# Altium footprint library LukaLIBRARY.PcbLib: 772 footprints (part 48 of 49)
Each footprint in its own frame and in the unit in brackets; x right, y up, seen from the top. Pads: shape width x height; smd on the part's side, far side on the other; paste and mask are expansions set on the pad; w line width, h text height; cw(c..) or ccw(c..) is an arc to the next point about the centre after c.
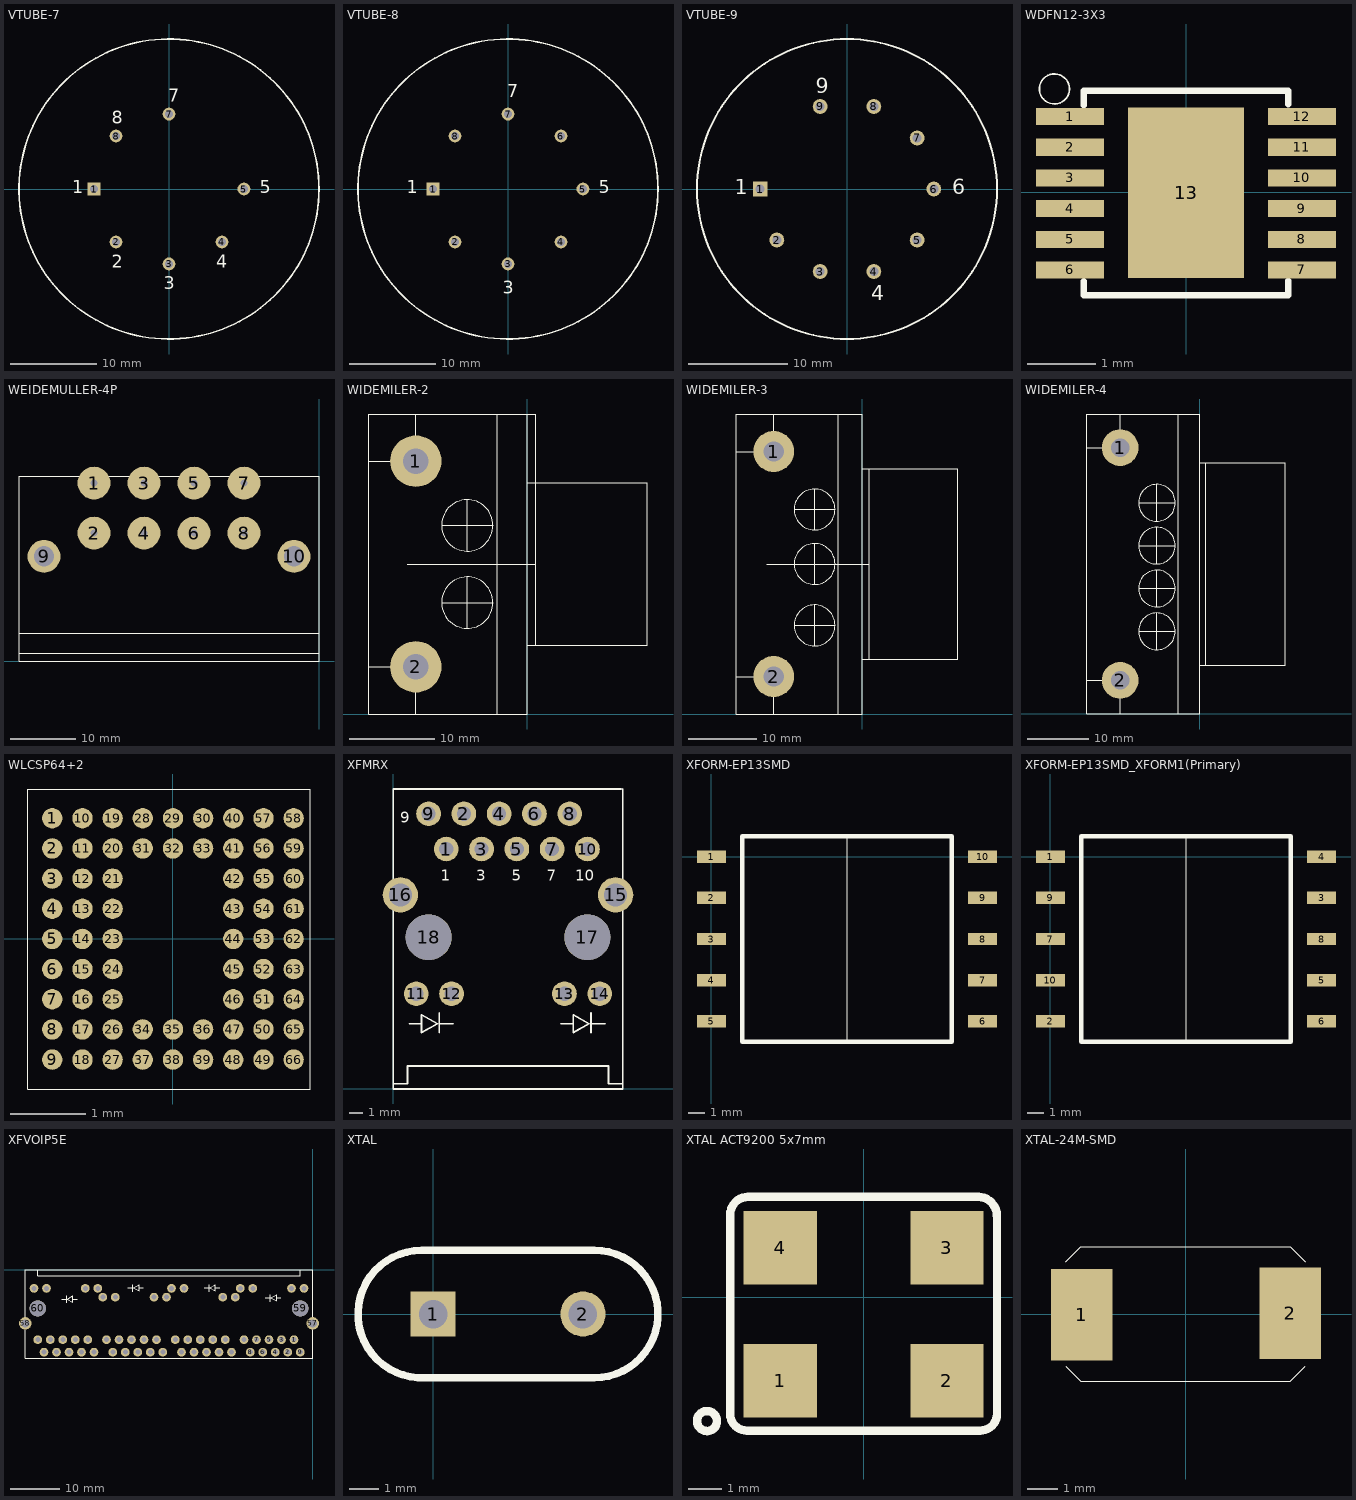
[diagram p47: the footprints below, top view; thin cyan lines are the x and y axes]

## VTUBE-7 [mm] "Vacuum Tube; 7 Leads"
height 108
pads (7):
  rect 1.5x1.5 hole 0.9: 1(-8.725,0)
  round 1.5 hole 0.9: 2(-6.17,-6.17) 3(0,-8.725) 4(6.17,-6.17) 5(8.725,0) 7(0,8.725) 8(-6.17,6.17)
Top Overlay:
  circle w0.2: c0,0 r17.462
  text "1" at -11.265,-0.508 h1.5
  text "2" at -6.693,-9.144 h1.5
  text "3" at -0.597,-11.684 h1.5
  text "4" at 5.499,-9.144 h1.5
  text "5" at 10.579,-0.508 h1.5
  text "7" at -0.089,10.16 h1.5
  text "8" at -6.693,7.62 h1.5

## VTUBE-8 [mm] "Vacuum Tube; 8 Leads"
height 108
pads (8):
  rect 1.5x1.5 hole 0.9: 1(-8.725,0)
  round 1.5 hole 0.9: 2(-6.17,-6.17) 3(0,-8.725) 4(6.17,-6.17) 5(8.725,0) 6(6.17,6.17) 7(0,8.725) 8(-6.17,6.17)
Top Overlay:
  circle w0.2: c0,0 r17.462
  text "7" at -0.089,10.668 h1.5
  text "5" at 10.579,-0.508 h1.5
  text "3" at -0.597,-12.192 h1.5
  text "1" at -11.773,-0.508 h1.5

## VTUBE-9 [mm] "Vacuum Tube; 9 Leads"
height 66.7
pads (9):
  rect 1.5x1.5 hole 0.9: 1(-8.725,0)
  round 1.5 hole 0.9: 2(-7.059,-5.128) 3(-2.696,-8.298) 4(2.696,-8.298) 5(7.059,-5.128) 6(8.725,0) 7(7.059,5.128) 8(2.696,8.298) 9(-2.696,8.298)
Top Overlay:
  circle w0.2: c0,0 r15.081
  text "4" at 2.451,-11.176 h1.5
  text "6" at 10.579,-0.508 h1.5
  text "9" at -3.137,9.652 h1.5
  text "1" at -11.265,-0.508 h1.5

## WDFN12-3X3 [mm]
pads (13):
  rect 1x0.25 smd mask-25.4: 1(-1.7,1.11) 2(-1.7,0.66) 3(-1.7,0.21) 4(-1.7,-0.24) 5(-1.7,-0.69) 6(-1.7,-1.14) 7(1.7,-1.14) 8(1.7,-0.69) 9(1.7,-0.24) 10(1.7,0.21) 11(1.7,0.66) 12(1.7,1.11)
  rect 1.7x2.5 smd mask-25.4: 13(0,-0.01)
Top Overlay:
  circle w0.025: c-1.93,1.515 r0.221
  lines w0.1: -1.5,-1.31 -1.5,-1.51 1.5,-1.51 1.5,-1.3 ; -1.5,1.28 -1.5,1.49 1.5,1.49 1.5,1.29
Top Solder:
  region: 2.2,-1.265 2.2,-1.015 1.2,-1.015 1.2,-1.265
  region: 2.2,-0.815 2.2,-0.565 1.2,-0.565 1.2,-0.815
  region: 2.2,-0.365 2.2,-0.115 1.2,-0.115 1.2,-0.365
  region: -1.2,-0.365 -1.2,-0.115 -2.2,-0.115 -2.2,-0.365
  region: -1.2,-0.815 -1.2,-0.565 -2.2,-0.565 -2.2,-0.815
  region: -2.2,-1.015 -2.2,-1.265 -1.2,-1.265 -1.2,-1.015
  region: 1.2,0.785 1.2,0.535 2.2,0.535 2.2,0.785
  region: 1.2,1.235 1.2,0.985 2.2,0.985 2.2,1.235
  region: -1.2,0.535 -1.2,0.785 -2.2,0.785 -2.2,0.535
  region: -1.2,0.985 -1.2,1.235 -2.2,1.235 -2.2,0.985
  region: -1.35,1.34 -1.35,-1.36 1.35,-1.36 1.35,1.34
  region: 2.2,0.085 2.2,0.335 1.2,0.335 1.2,0.085
  region: -1.2,0.085 -1.2,0.335 -2.2,0.335 -2.2,0.085

## WEIDEMULLER-4P [mm]
pads (10):
  round 5 hole 1.1: 1(-34.29,27.178) 2(-34.29,19.558) 3(-26.67,27.178) 4(-26.67,19.558) 5(-19.05,27.178) 6(-19.05,19.558) 7(-11.43,27.178) 8(-11.43,19.558)
  round 5 hole 3.1 mask-25.4: 9(-41.91,16.002) 10(-3.81,16.002)
Top Overlay:
  lines w0.01: 0,1.27 -45.72,1.27 ; 0,4.318 -45.72,4.318 -45.72,1.27 ; -45.72,0 -45.72,1.27 ; -45.72,0 -45.72,28.194 0,28.194 0,0 -45.72,0
Top Solder:
  region: -41.91,19.011 -42.381,18.974 -42.84,18.864 -43.276,18.683 -43.679,18.437 -44.038,18.13 -44.345,17.771 -44.591,17.368 -44.772,16.932 -44.882,16.473 -44.919,16.002 -44.882,15.531 -44.772,15.072 -44.591,14.636 -44.345,14.233 -44.038,13.874 -43.679,13.567 -43.276,13.321 -42.84,13.14 -42.381,13.03 -41.91,12.993 -41.439,13.03 -40.98,13.14 -40.544,13.321 -40.141,13.567 -39.782,13.874 -39.475,14.233 -39.229,14.636 -39.048,15.072 -38.938,15.531 -38.901,16.002 -38.938,16.473 -39.048,16.932 -39.229,17.368 -39.475,17.771 -39.782,18.13 -40.141,18.437 -40.544,18.683 -40.98,18.864 -41.439,18.974
  region: -3.81,19.011 -4.281,18.974 -4.74,18.864 -5.176,18.683 -5.579,18.437 -5.938,18.13 -6.245,17.771 -6.491,17.368 -6.672,16.932 -6.782,16.473 -6.819,16.002 -6.782,15.531 -6.672,15.072 -6.491,14.636 -6.245,14.233 -5.938,13.874 -5.579,13.567 -5.176,13.321 -4.74,13.14 -4.281,13.03 -3.81,12.993 -3.339,13.03 -2.88,13.14 -2.444,13.321 -2.041,13.567 -1.682,13.874 -1.375,14.233 -1.129,14.636 -0.948,15.072 -0.838,15.531 -0.801,16.002 -0.838,16.473 -0.948,16.932 -1.129,17.368 -1.375,17.771 -1.682,18.13 -2.041,18.437 -2.444,18.683 -2.88,18.864 -3.339,18.974
Bottom Solder:
  region: -41.91,19.011 -42.381,18.974 -42.84,18.864 -43.276,18.683 -43.679,18.437 -44.038,18.13 -44.345,17.771 -44.591,17.368 -44.772,16.932 -44.882,16.473 -44.919,16.002 -44.882,15.531 -44.772,15.072 -44.591,14.636 -44.345,14.233 -44.038,13.874 -43.679,13.567 -43.276,13.321 -42.84,13.14 -42.381,13.03 -41.91,12.993 -41.439,13.03 -40.98,13.14 -40.544,13.321 -40.141,13.567 -39.782,13.874 -39.475,14.233 -39.229,14.636 -39.048,15.072 -38.938,15.531 -38.901,16.002 -38.938,16.473 -39.048,16.932 -39.229,17.368 -39.475,17.771 -39.782,18.13 -40.141,18.437 -40.544,18.683 -40.98,18.864 -41.439,18.974
  region: -3.81,19.011 -4.281,18.974 -4.74,18.864 -5.176,18.683 -5.579,18.437 -5.938,18.13 -6.245,17.771 -6.491,17.368 -6.672,16.932 -6.782,16.473 -6.819,16.002 -6.782,15.531 -6.672,15.072 -6.491,14.636 -6.245,14.233 -5.938,13.874 -5.579,13.567 -5.176,13.321 -4.74,13.14 -4.281,13.03 -3.81,12.993 -3.339,13.03 -2.88,13.14 -2.444,13.321 -2.041,13.567 -1.682,13.874 -1.375,14.233 -1.129,14.636 -0.948,15.072 -0.838,15.531 -0.801,16.002 -0.838,16.473 -0.948,16.932 -1.129,17.368 -1.375,17.771 -1.682,18.13 -2.041,18.437 -2.444,18.683 -2.88,18.864 -3.339,18.974

## WIDEMILER-2 [mm]
pads (2):
  round 6 hole 3: 1(-13,29.5) 2(-13,5.5)
Top Overlay:
  circle w0.01: c-7,13 r3
  circle w0.01: c-7,22 r3
  lines w0.01: -18.5,5.5 -13,5.5 -13,0 -18.5,0 ; -18.5,29.5 -13,29.5 -13,35 -18.5,35 ; -14,17.5 1,17.5 ; -10,13 -4,13 ; -10,22 -4,22 ; -7,10 -7,16 ; -7,19 -7,25 ; -3.5,35 -3.5,0 ; 0,8 14,8 14,27 0,27 ; 0,35 0,0 -3.5,0 ; 1,8 1,22 1,27 1,35 -18.5,35 ; -18.5,0 -18.5,35 ; -18.5,0 -3.5,0
Top Solder:
  region: -13,8.509 -13.471,8.472 -13.93,8.362 -14.366,8.181 -14.769,7.935 -15.128,7.628 -15.435,7.269 -15.681,6.866 -15.862,6.43 -15.972,5.971 -16.009,5.5 -15.972,5.029 -15.862,4.57 -15.681,4.134 -15.435,3.731 -15.128,3.372 -14.769,3.065 -14.366,2.819 -13.93,2.638 -13.471,2.528 -13,2.491 -12.529,2.528 -12.07,2.638 -11.634,2.819 -11.231,3.065 -10.872,3.372 -10.565,3.731 -10.319,4.134 -10.138,4.57 -10.028,5.029 -9.991,5.5 -10.028,5.971 -10.138,6.43 -10.319,6.866 -10.565,7.269 -10.872,7.628 -11.231,7.935 -11.634,8.181 -12.07,8.362 -12.529,8.472
  region: -13,32.509 -13.471,32.472 -13.93,32.362 -14.366,32.181 -14.769,31.935 -15.128,31.628 -15.435,31.269 -15.681,30.866 -15.862,30.43 -15.972,29.971 -16.009,29.5 -15.972,29.029 -15.862,28.57 -15.681,28.134 -15.435,27.731 -15.128,27.372 -14.769,27.065 -14.366,26.819 -13.93,26.638 -13.471,26.528 -13,26.491 -12.529,26.528 -12.07,26.638 -11.634,26.819 -11.231,27.065 -10.872,27.372 -10.565,27.731 -10.319,28.134 -10.138,28.57 -10.028,29.029 -9.991,29.5 -10.028,29.971 -10.138,30.43 -10.319,30.866 -10.565,31.269 -10.872,31.628 -11.231,31.935 -11.634,32.181 -12.07,32.362 -12.529,32.472

## WIDEMILER-3 [mm]
pads (2):
  round 6 hole 3: 1(-13,38.5) 2(-13,5.5)
Top Overlay:
  circle w0.01: c-7,30 r3
  circle w0.01: c-7,22 r3
  circle w0.01: c-7,13 r3
  lines w0.01: -18.5,5.5 -13,5.5 -13,0 -18.5,0 ; -18.5,38.5 -13,38.5 -13,44 -18.5,44 ; -14,22 1,22 ; -10,13 -4,13 ; -10,30 -4,30 ; -7,10 -7,16 ; -7,19 -7,25 ; -7,27 -7,33 ; 0,8 14,8 14,36 0,36 ; 1,8 1,22 ; 1,36 1,22 ; -18.5,0 -3.5,0 ; -18.5,0 -18.5,44 ; -18.5,44 -3.5,44 ; -3.5,0 -3.5,44 ; -3.5,0 0,0 0,44 -3.5,44
Top Solder:
  region: -13,41.509 -13.471,41.472 -13.93,41.362 -14.366,41.181 -14.769,40.935 -15.128,40.628 -15.435,40.269 -15.681,39.866 -15.862,39.43 -15.972,38.971 -16.009,38.5 -15.972,38.029 -15.862,37.57 -15.681,37.134 -15.435,36.731 -15.128,36.372 -14.769,36.065 -14.366,35.819 -13.93,35.638 -13.471,35.528 -13,35.491 -12.529,35.528 -12.07,35.638 -11.634,35.819 -11.231,36.065 -10.872,36.372 -10.565,36.731 -10.319,37.134 -10.138,37.57 -10.028,38.029 -9.991,38.5 -10.028,38.971 -10.138,39.43 -10.319,39.866 -10.565,40.269 -10.872,40.628 -11.231,40.935 -11.634,41.181 -12.07,41.362 -12.529,41.472
  region: -13,8.509 -13.471,8.472 -13.93,8.362 -14.366,8.181 -14.769,7.935 -15.128,7.628 -15.435,7.269 -15.681,6.866 -15.862,6.43 -15.972,5.971 -16.009,5.5 -15.972,5.029 -15.862,4.57 -15.681,4.134 -15.435,3.731 -15.128,3.372 -14.769,3.065 -14.366,2.819 -13.93,2.638 -13.471,2.528 -13,2.491 -12.529,2.528 -12.07,2.638 -11.634,2.819 -11.231,3.065 -10.872,3.372 -10.565,3.731 -10.319,4.134 -10.138,4.57 -10.028,5.029 -9.991,5.5 -10.028,5.971 -10.138,6.43 -10.319,6.866 -10.565,7.269 -10.872,7.628 -11.231,7.935 -11.634,8.181 -12.07,8.362 -12.529,8.472

## WIDEMILER-4 [mm]
pads (2):
  round 6 hole 3: 1(-13,43.5) 2(-13,5.5)
Top Overlay:
  circle w0.01: c-7,13.5 r3
  circle w0.01: c-7,20.5 r3
  circle w0.01: c-7,27.5 r3
  circle w0.01: c-7,34.5 r3
  lines w0.01: -18.5,5.5 -13,5.5 -13,0 -18.5,0 ; -18.5,43.5 -13,43.5 -13,49 -18.5,49 ; -10,13.5 -4,13.5 ; -10,20.5 -4,20.5 ; -10,27.5 -4,27.5 ; -10,34.5 -4,34.5 ; -7,10.5 -7,16.5 ; -7,17.5 -7,23.5 ; -7,24.5 -7,30.5 ; -7,31.5 -7,37.5 ; -3.5,49 -3.5,0 ; 0,8 14,8 14,41 0,41 ; 1,8 1,22 1,27 1,41 ; -18.5,0 -18.5,35 -18.5,49 ; -18.5,0 -3.5,0 ; -18.5,49 0,49 0,0 -3.5,0
Top Solder:
  region: -13,8.509 -13.471,8.472 -13.93,8.362 -14.366,8.181 -14.769,7.935 -15.128,7.628 -15.435,7.269 -15.681,6.866 -15.862,6.43 -15.972,5.971 -16.009,5.5 -15.972,5.029 -15.862,4.57 -15.681,4.134 -15.435,3.731 -15.128,3.372 -14.769,3.065 -14.366,2.819 -13.93,2.638 -13.471,2.528 -13,2.491 -12.529,2.528 -12.07,2.638 -11.634,2.819 -11.231,3.065 -10.872,3.372 -10.565,3.731 -10.319,4.134 -10.138,4.57 -10.028,5.029 -9.991,5.5 -10.028,5.971 -10.138,6.43 -10.319,6.866 -10.565,7.269 -10.872,7.628 -11.231,7.935 -11.634,8.181 -12.07,8.362 -12.529,8.472
  region: -13,46.509 -13.471,46.472 -13.93,46.362 -14.366,46.181 -14.769,45.935 -15.128,45.628 -15.435,45.269 -15.681,44.866 -15.862,44.43 -15.972,43.971 -16.009,43.5 -15.972,43.029 -15.862,42.57 -15.681,42.134 -15.435,41.731 -15.128,41.372 -14.769,41.065 -14.366,40.819 -13.93,40.638 -13.471,40.528 -13,40.491 -12.529,40.528 -12.07,40.638 -11.634,40.819 -11.231,41.065 -10.872,41.372 -10.565,41.731 -10.319,42.134 -10.138,42.57 -10.028,43.029 -9.991,43.5 -10.028,43.971 -10.138,44.43 -10.319,44.866 -10.565,45.269 -10.872,45.628 -11.231,45.935 -11.634,46.181 -12.07,46.362 -12.529,46.472

## WLCSP64+2 [mm]
pads (66):
  round 0.27 smd: 1(-1.6,1.6) 2(-1.6,1.2) 3(-1.6,0.8) 4(-1.6,0.4) 5(-1.6,0) 6(-1.6,-0.4) 7(-1.6,-0.8) 8(-1.6,-1.2) 9(-1.6,-1.6) 10(-1.2,1.6) 11(-1.2,1.2) 12(-1.2,0.8) 13(-1.2,0.4) 14(-1.2,0) 15(-1.2,-0.4) 16(-1.2,-0.8) 17(-1.2,-1.2) 18(-1.2,-1.6) 19(-0.8,1.6) 20(-0.8,1.2) 21(-0.8,0.8) 22(-0.8,0.4) 23(-0.8,0) 24(-0.8,-0.4) 25(-0.8,-0.8) 26(-0.8,-1.2) 27(-0.8,-1.6) 28(-0.4,1.6) 29(0,1.6) 30(0.4,1.6) 31(-0.4,1.2) 32(0,1.2) 33(0.4,1.2) 34(-0.4,-1.2) 35(0,-1.2) 36(0.4,-1.2) 37(-0.4,-1.6) 38(0,-1.6) 39(0.4,-1.6) 40(0.8,1.6) 41(0.8,1.2) 42(0.8,0.8) 43(0.8,0.4) 44(0.8,0) 45(0.8,-0.4) 46(0.8,-0.8) 47(0.8,-1.2) 48(0.8,-1.6) 49(1.2,-1.6) 50(1.2,-1.2) 51(1.2,-0.8) 52(1.2,-0.4) 53(1.2,0) 54(1.2,0.4) 55(1.2,0.8) 56(1.2,1.2) 57(1.2,1.6) 58(1.6,1.6) 59(1.6,1.2) 60(1.6,0.8) 61(1.6,0.4) 62(1.6,0) 63(1.6,-0.4) 64(1.6,-0.8) 65(1.6,-1.2) 66(1.6,-1.6)
Top Overlay:
  lines w0.001: 1.82,1.988 1.819,-1.99 -1.926,-1.99 -1.926,1.987 1.821,1.987

## XFMRX [mil]
pads (18):
  round 70 hole 40 mask-1000: 1(150,680) 2(200,780) 3(250,680) 4(300,780) 5(350,680) 6(400,780) 7(450,680) 8(500,780) 9(100,780) 10(550,680) 11(65,270) 12(165,270) 13(485,270) 14(585,270)
  round 100 hole 65: 15(630,550) 16(20,550)
  round 130 hole 130: 17(550,430) 18(100,430)
Top Overlay:
  lines w5: 0,15 40,15 40,40 40,65 610,65 610,40 610,15 650,15 ; 45,185 80,185 80,160 125,185 80,210 80,180 ; 130,160 130,215 ; 130,185 170,185 ; 475,185 510,185 510,160 555,185 510,210 510,180 ; 560,160 560,215 ; 560,185 600,185 ; 645,850 0,850 0,0 650,0 650,850
  text "3" at 235,590 h31.25
  text "1" at 135,590 h31.25
  text "9" at 20,755 h31.25
  text "5" at 335,590 h31.25
  text "10" at 515,590 h31.25
  text "7" at 435,590 h31.25
Top Solder:
  drawing of 14 lines, arcs and shapes, not listed
Bottom Solder:
  drawing of 14 lines, arcs and shapes, not listed

## XFORM-EP13SMD [mil]
pads (10):
  rect 70x30 smd: 1(0,0) 2(0,-100) 3(0,-200) 4(0,-300) 5(0,-400) 6(660,-400) 7(660,-300) 8(660,-200) 9(660,-100) 10(660,0)
Top Overlay:
  lines w1: 330,-450 330,50
  lines w10: 75,-450 75,50 585,50 585,-450 75,-450

## XFORM-EP13SMD_XFORM1(Primary) [mil]
pads (10):
  rect 70x30 smd: 1(0,0) 2(0,-400) 3(660,-100) 4(660,0) 5(660,-300) 6(660,-400) 7(0,-200) 8(660,-200) 9(0,-100) 10(0,-300)
Top Overlay:
  lines w1: 330,-450 330,50
  lines w10: 75,-450 585,-450 585,50 75,50 75,-450

## XFVOIP5E [mil]
pads (60):
  round 70 hole 40 mask-1000: 1(-150,-560) 2(-200,-660) 3(-250,-560) 4(-300,-660) 5(-350,-560) 6(-400,-660) 7(-450,-560) 8(-500,-660) 9(-100,-660) 10(-550,-560) 11(-700,-560) 12(-750,-660) 13(-800,-560) 14(-850,-660) 15(-900,-560) 16(-950,-660) 17(-1000,-560) 18(-1050,-660) 19(-650,-660) 20(-1100,-560) 21(-1250,-560) 22(-1300,-660) 23(-1350,-560) 24(-1400,-660) 25(-1450,-560) 26(-1500,-660) 27(-1550,-560) 28(-1600,-660) 29(-1200,-660) 30(-1650,-560) 31(-1800,-560) 32(-1850,-660) 33(-1900,-560) 34(-1950,-660) 35(-2000,-560) 36(-2050,-660) 37(-2100,-560) 38(-2150,-660) 39(-1750,-660) 40(-2200,-560) 41(-70,-150) 42(-170,-150) 43(-480,-150) 44(-580,-150) 45(-620,-220) 46(-720,-220) 47(-1030,-150) 48(-1130,-150) 49(-1170,-220) 50(-1270,-220) 51(-1580,-220) 52(-1680,-220) 53(-1720,-150) 54(-1820,-150) 55(-2130,-150) 56(-2230,-150)
  round 100 hole 65: 57(0,-430) 58(-2300,-430)
  round 130 hole 130: 59(-100,-310) 60(-2200,-310)
Top Layer:
  lines w3.94: 0,-310 0,-220
Top Overlay:
  lines w3.94: -2300,-480 -2300,-710 0,-710 0,-480 ; -2300,-380 -2300,0 ; -100,0 -100,-50 -2200,-50 -2200,0 -2300,0 ; 0,-380 0,0 -2300,0
  lines w5: -2010,-235 -1970,-235 ; -1970,-265 -1970,-210 ; -1920,-230 -1920,-260 -1965,-235 -1920,-210 -1920,-235 -1885,-235 ; -1480,-145 -1440,-145 ; -1440,-175 -1440,-120 ; -1390,-140 -1390,-170 -1435,-145 -1390,-120 -1390,-145 -1355,-145 ; -870,-145 -830,-145 ; -830,-175 -830,-120 ; -780,-140 -780,-170 -825,-145 -780,-120 -780,-145 -745,-145 ; -380,-225 -340,-225 ; -340,-255 -340,-200 ; -290,-220 -290,-250 -335,-225 -290,-200 -290,-225 -255,-225
Top Solder:
  drawing of 56 lines, arcs and shapes, not listed
Bottom Solder:
  drawing of 56 lines, arcs and shapes, not listed

## XTAL [mil]
pads (2):
  rect 60x60 hole 38 mask-1000: 1(0,0)
  round 60 hole 38 mask-1000: 2(200,0)
Top Overlay:
  lines w10: -10,-85 215,-85 ccw(c215,0) 215,85 -15,85 ccw(c-15,0) -9.96,-84.85
Top Solder:
  region: -30,-30 30,-30 30,30 -30,30
  region: 200,30.26 192.17,29.23 184.87,26.2 178.6,21.4 173.79,15.13 170.77,7.83 169.74,0 170.77,-7.83 173.79,-15.13 178.6,-21.4 184.87,-26.2 192.17,-29.23 200,-30.26 207.83,-29.23 215.13,-26.2 221.4,-21.4 226.21,-15.13 229.23,-7.83 230.26,0 229.23,7.83 226.21,15.13 221.4,21.4 215.13,26.2 207.83,29.23
Bottom Solder:
  region: -30,-30 30,-30 30,30 -30,30
  region: 200,30.26 192.17,29.23 184.87,26.2 178.6,21.4 173.79,15.13 170.77,7.83 169.74,0 170.77,-7.83 173.79,-15.13 178.6,-21.4 184.87,-26.2 192.17,-29.23 200,-30.26 207.83,-29.23 215.13,-26.2 221.4,-21.4 226.21,-15.13 229.23,-7.83 230.26,0 229.23,7.83 226.21,15.13 221.4,21.4 215.13,26.2 207.83,29.23

## XTAL ACT9200 5x7mm [mm] "5x7mm"
pads (4):
  rect 2.2x2.2 smd mask-25.4: 1(-2.5,-2.5) 2(2.5,-2.5) 3(2.5,1.484) 4(-2.5,1.484)
Top Overlay:
  circle w0.254: c-4.694,-3.708 r0.3
  lines w0.254: -4,-3.5 -4,2.465 ; -4,2.475 cw(c-3.466,2.475) -3.466,3.009 ; -4,-3.495 ccw(c-3.5,-3.495) -3.5,-3.995 ; -3.5,-4 3.5,-4 ; -3.466,3.009 3.459,3.009 ; 3.44,3.009 cw(c3.44,2.454) 3.996,2.454 ; 3.5,-3.995 ccw(c3.5,-3.495) 4,-3.495 ; 4,-3.5 4,2.454
Top Solder:
  region: 1.4,0.384 3.6,0.384 3.6,2.584 1.4,2.584
  region: -3.6,0.384 -1.4,0.384 -1.4,2.584 -3.6,2.584
  region: 1.4,-3.6 3.6,-3.6 3.6,-1.4 1.4,-1.4
  region: -3.6,-3.6 -1.4,-3.6 -1.4,-1.4 -3.6,-1.4

## XTAL-24M-SMD [mm]
pads (2):
  rect 2.048x3.048 smd mask-25.4: 1(-3.475,-0.025) 2(3.5,0.025)
Top Overlay:
  lines w0.01: -4,-1.75 -3.5,-2.25 3.5,-2.25 4,-1.75 ; -4,1.75 -3.5,2.25 3.5,2.25 4,1.75
Top Solder:
  region: -4.999,-1.549 -1.951,-1.549 -1.951,1.499 -4.999,1.499
  region: 1.976,-1.499 5.024,-1.499 5.024,1.549 1.976,1.549